# Altium footprint library pcb.PcbLib: 397 footprints (part 18 of 25)
Each footprint in its own frame and in the unit in brackets; x right, y up, seen from the top. Pads: shape width x height; smd on the part's side, far side on the other; paste and mask are expansions set on the pad; w line width, h text height; cw(c..) or ccw(c..) is an arc to the next point about the centre after c.
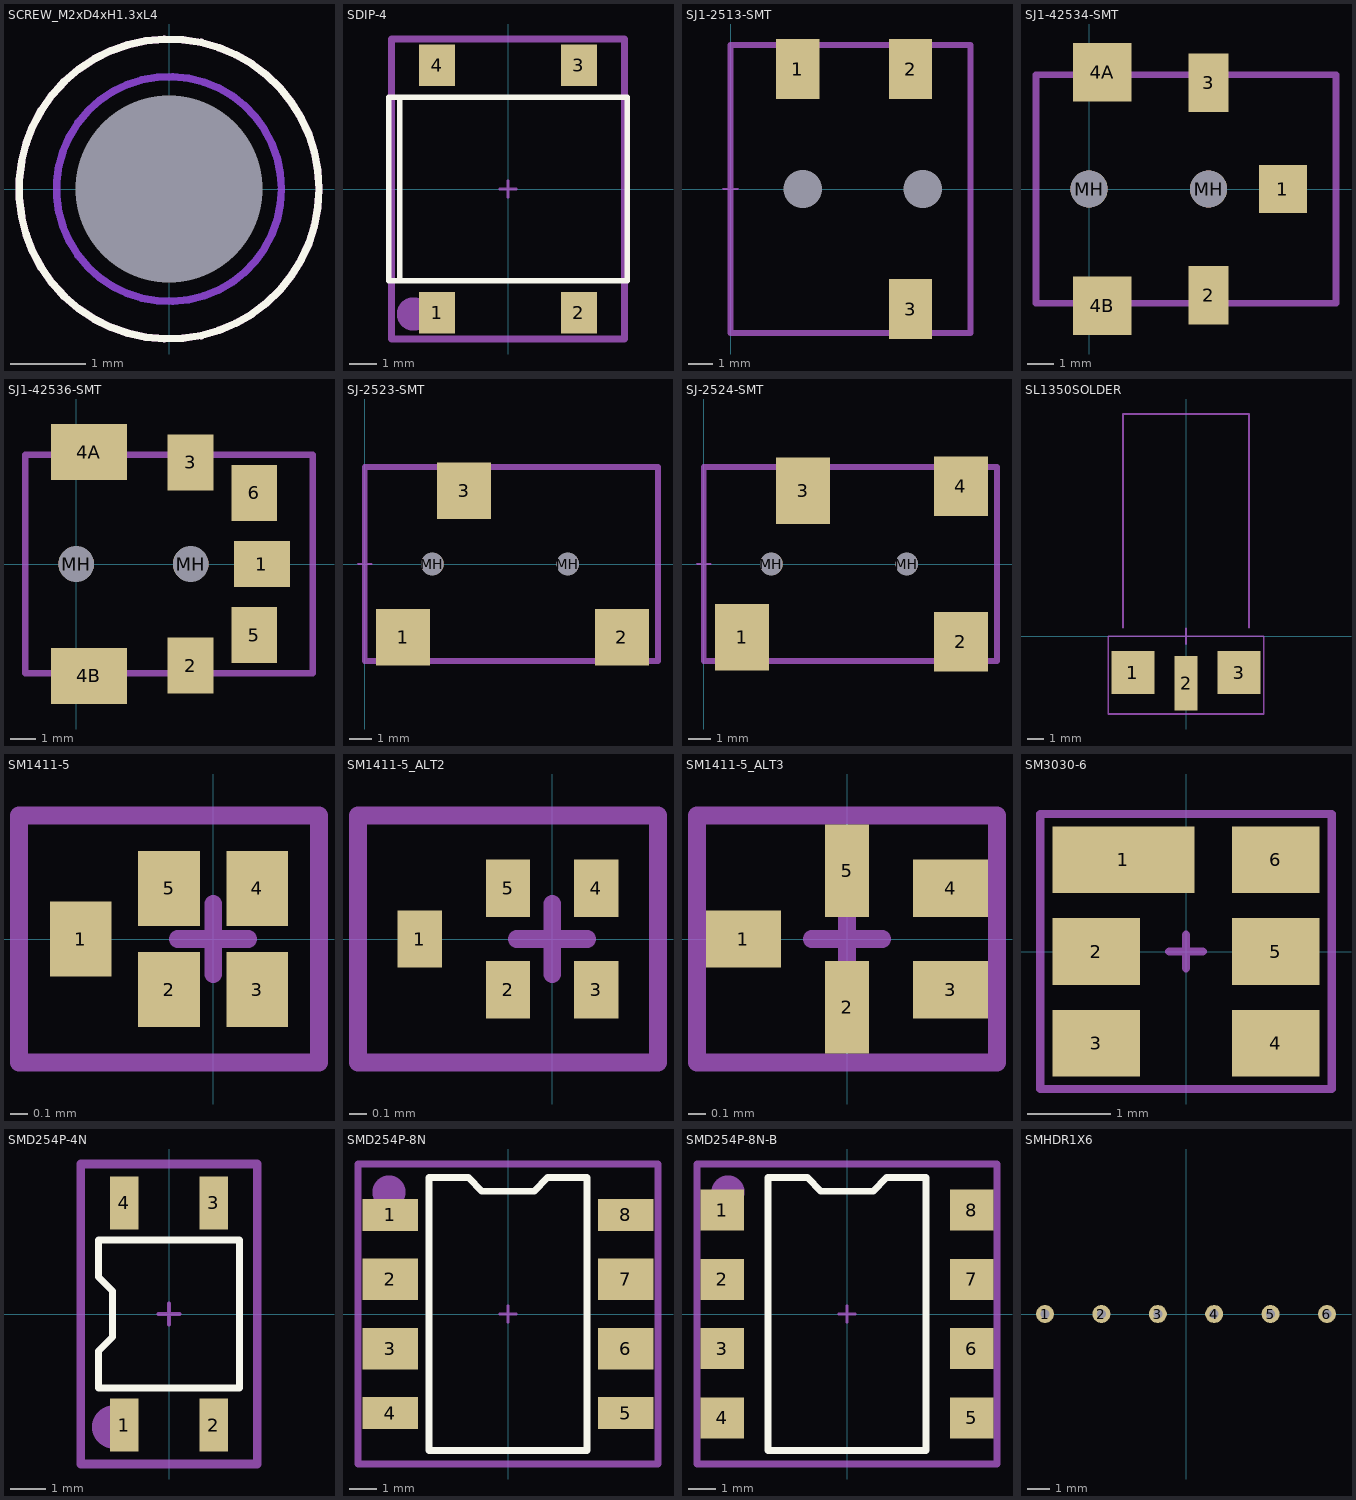
[diagram p17: the footprints below, top view; thin cyan lines are the x and y axes]

## SCREW_M2xD4xH1.3xL4 [mm]
height 1.6
pads (1):
  round 0 hole 2.5 unplated paste-25.4 mask+1.25: 0(0,0)
Top Layer keep-out:
  circle w0.1: c0,0 r2
Bottom Layer keep-out:
  circle w0.1: c0,0 r1.5
Top Overlay:
  circle w0.1: c0,0 r2
3D body: height 0, standoff -3, extent -1,-0.998 0.992,0.998
3D body: height 1.6, standoff 0, extent -1.984,-1.992 2,2

## SDIP-4 [mm]
height 2.6
pads (4):
  rect 1.3x1.5 smd: 1(-2.55,-4.45) 2(2.55,-4.45) 3(2.55,4.45) 4(-2.55,4.45)
Top Overlay:
  lines w0.2: -3.9,-3.3 -3.9,3.3 ; -4.3,-3.3 -4.3,3.3 4.3,3.3 4.3,-3.3 -4.3,-3.3
Mechanical 15:
  circle w1: c-3.4,-4.5 r0.1
  lines w0.1: -0.3,0 0.3,0 ; 0,-0.3 0,0.3
  lines w0.254: -4.2,-5.4 4.2,-5.4 4.2,5.4 -4.2,5.4 -4.2,-5.4
  text ".Designator" at -3.5,-2.8 h1.02
3D body: height 2.5, standoff 0, extent -4.2,-3.2 4.2,3.2

## SJ1-2513-SMT [mm] "2.5 MM AUDIO JACKS"
height 4.6
pads (5):
  rect 1.8x2.5 smd: 1(2.8,5) 2(7.5,5) 3(7.5,-5)
  round 0 hole 1.6: MH(3,0) MH(8,0)
Mechanical 15:
  lines w0.1: -0.3,0 0.3,0 ; 0,-0.3 0,0.3
  lines w0.254: 0,-6 0,6 10,6 10,-6 0,-6
  text "pcb_edge" at -0.6,-3.8 h1.02
  text ".Designator" at 0.5,-5.2 h1.02
3D body "SJ1-2513-SMT.stp": height 4.1, standoff -0.45, extent -2,-6 10,6

## SJ1-42534-SMT [mm] "2.5 MM AUDIO JACKS"
height 4.5
pads (7):
  rect 1.8x1.8 smd: 1(7.3,0)
  rect 1.5x2.2 smd mask+0.102: 2(4.5,-4)
  rect 1.5x2.2 smd: 3(4.5,4)
  rect 2.2x2.2 smd: 4A(0.5,4.4) 4B(0.5,-4.4)
  round 1.4 hole 1.4 unplated: MH(0,0) MH(4.5,0)
Mechanical 15:
  lines w0.1: -0.3,0 0.3,0 ; 0,-0.3 0,0.3
  lines w0.254: -2,-4.3 9.3,-4.3 9.3,4.3 -2,4.3 -2,-4.3
  text ".Designator" at -1.3,-3 h1.02
  text "pcb_edge" at -2.6,-3.6 h1.02
3D body "SJ1-42534-SMT.stp": height 5.05, standoff -0.55, extent -4.5,-5.2 8,5.2

## SJ1-42536-SMT [mm] "2.5 MM AUDIO JACKS"
height 4.5
pads (9):
  rect 2.2x1.8 smd: 1(7.3,0)
  rect 1.8x2.2 smd mask+0.102: 2(4.5,-4)
  rect 1.8x2.2 smd: 3(4.5,4) 5(7,-2.8) 6(7,2.8)
  rect 3x2.2 smd: 4A(0.5,4.4) 4B(0.5,-4.4)
  round 1.4 hole 1.4 unplated: MH(0,0) MH(4.5,0)
Mechanical 15:
  lines w0.1: -0.3,0 0.3,0 ; 0,-0.3 0,0.3
  lines w0.254: -2,-4.3 -2,4.3 9.3,4.3 9.3,-4.3 -2,-4.3
  text "pcb_edge" at -2.6,-3.6 h1.02
  text ".Designator" at -1.3,-3 h1.02
3D body "SJ1-42536-SMT.stp": height 5.1, standoff -0.5, extent -4.45,-5.2 8.05,5.2

## SJ-2523-SMT [mm] "2.5 MM AUDIO JACKS"
height 4.6
pads (5):
  rect 2.4x2.5 smd: 1(1.7,-3.25) 2(11.4,-3.25) 3(4.4,3.25)
  round 1 hole 1: MH(3,0) MH(9,0)
Mechanical 15:
  lines w0.1: -0.3,0 0.3,0 ; 0,-0.3 0,0.3
  lines w0.254: 0,-4.3 13,-4.3 13,4.3 0,4.3 0,-4.3
  text ".Designator" at 1.4,-3.5 h1.02
  text "pcb_edge" at -0.6,-3.8 h1.02
3D body "SJ-2523-SMT.stp": height 4.6, standoff -0.7, extent -1.45,-4 12.05,4

## SJ-2524-SMT [mm] "2.5 MM AUDIO JACKS"
height 4.6
pads (6):
  rect 2.4x2.95 smd: 1(1.7,-3.25) 3(4.4,3.25)
  rect 2.4x2.65 smd: 2(11.4,-3.45) 4(11.4,3.45)
  round 1 hole 1: MH(3,0) MH(9,0)
Mechanical 15:
  lines w0.1: -0.3,0 0.3,0 ; 0,-0.3 0,0.3
  lines w0.254: 0,-4.3 0,4.3 13,4.3 13,-4.3 0,-4.3
  text "pcb_edge" at -0.6,-3.8 h1.02
  text ".Designator" at 1.4,-3.5 h1.02
3D body "SJ-2523-SMT.stp": height 4.6, standoff -0.7, extent -1.45,-4 12.05,4

## SL1350SOLDER [mm] "SL1350"
pads (3):
  rect 2.6x2.6 smd: 1(-3.2,-2.2) 3(3.2,-2.2)
  rect 1.4x3.3 smd: 2(0,-2.85)
Mechanical 15:
  lines w0.1: -3.8,0.5 -3.8,13.4 3.8,13.4 3.8,0.5 ; -0.475,0 0.475,0 ; 0,-0.475 0,0.475 ; -4.7,-4.7 4.7,-4.7 4.7,0 -4.7,0 -4.7,-4.7
  text "pcb_edge" at 12.8,0.3 h1.02
  text ".Designator" at -4.132,-4.382 h1.02
3D body "SL1350 ANTENNA.stp": height 4.18, standoff -3.38, extent -3.782,-3.065 3.775,13.4

## SM1411-5 [mm] "SAW Filter 5 pin"
height 0.7
pads (5):
  rect 0.35x0.425 smd paste-0.03 mask+0.06: 1(-0.75,0) 2(-0.25,-0.288) 3(0.25,-0.288) 4(0.25,0.288) 5(-0.25,0.288)
Mechanical 15:
  lines w0.1: -0.2,0 0.2,0 ; 0,-0.2 0,0.2 ; -1.1,-0.7 0.6,-0.7 0.6,0.7 -1.1,0.7 -1.1,-0.7
  text ".Designator" at -0.9,-0.4 h0.51
3D body: height 0.5, standoff 0, extent -0.9,-0.5 0.5,0.5

## SM1411-5_ALT2 [mm] "SAW Filter 5 pin"
height 0.7
pads (5):
  rect 0.25x0.325 smd paste-0.03 mask+0.06: 1(-0.75,0) 2(-0.25,-0.288) 3(0.25,-0.288) 4(0.25,0.288) 5(-0.25,0.288)
Mechanical 15:
  lines w0.1: -0.2,0 0.2,0 ; 0,-0.2 0,0.2 ; -1.1,-0.7 0.6,-0.7 0.6,0.7 -1.1,0.7 -1.1,-0.7
  text ".Designator" at -0.9,-0.4 h0.51
3D body: height 0.5, standoff 0, extent -0.9,-0.5 0.5,0.5

## SM1411-5_ALT3 [mm] "SAW Filter 5 pin"
height 0.7
pads (5):
  rect 0.425x0.325 smd paste-0.03 mask+0.06: 1(-0.587,0) 3(0.587,-0.288) 4(0.587,0.288)
  rect 0.25x0.525 smd paste-0.03 mask+0.06: 2(0,-0.387) 5(0,0.388)
Mechanical 15:
  lines w0.1: -0.2,0 0.2,0 ; 0,-0.2 0,0.2 ; -0.85,-0.7 -0.85,0.7 0.85,0.7 0.85,-0.7 -0.85,-0.7
  text ".Designator" at -0.7,-0.55 h0.4
3D body: height 0.7, standoff 0, extent -0.7,-0.55 0.7,0.55

## SM3030-6 [mm] "SAW Filter 6 pin"
height 1.25
pads (6):
  rect 1.7x0.8 smd paste-0.03 mask+0.06: 1(-0.75,1.1)
  rect 1.05x0.8 smd paste-0.03 mask+0.06: 2(-1.075,0) 3(-1.075,-1.1) 4(1.075,-1.1) 5(1.075,0) 6(1.075,1.1)
Mechanical 15:
  lines w0.1: -0.2,0 0.2,0 ; 0,-0.2 0,0.2 ; -1.75,-1.65 -1.75,1.65 1.75,1.65 1.75,-1.65 -1.75,-1.65
  text ".Designator" at -1.3,-1.35 h0.51
3D body: height 0.5, standoff 0, extent -1.5,-1.5 1.5,1.5

## SMD254P-4N [mm]
height 2.7
pads (4):
  rect 0.8x1.5 smd: 1(-1.27,-3.15) 2(1.27,-3.15) 3(1.27,3.15) 4(-1.27,3.15)
Top Overlay:
  lines w0.2: -2,-2.1 -2,-1.05 -1.6,-0.65 -1.6,0.65 -2,1.05 -2,2.1 2,2.1 2,-2.1 -2,-2.1
Mechanical 15:
  circle w1.016: c-1.573,-3.2 r0.1
  lines w0.1: -0.3,0 0.3,0 ; 0,-0.3 0,0.3
  lines w0.254: -2.5,-4.25 -2.5,4.25 2.5,4.25 2.5,-4.25 -2.5,-4.25
  text ".Designator" at -2.032,1.118 h1.02
3D body: height 2.6, standoff 0, extent -1.8,-2.2 1.8,2.2

## SMD254P-8N [mil]
height 157.48
pads (8):
  rect 80x46 smd: 1(-170,143) 4(-170,-143) 5(170,-143) 8(170,143)
  rect 80x60 smd: 2(-170,50) 3(-170,-50) 6(170,-50) 7(170,50)
Top Overlay:
  lines w10: -114.17,-196.85 114.17,-196.85 114.17,196.85 57.09,196.85 37.4,177.17 -37.4,177.17 -57.09,196.85 -114.17,196.85 -114.17,-196.85
Mechanical 15:
  circle w40: c-171.94,176 r3.94
  lines w3.94: -11.81,0 11.81,0 ; 0,-11.81 0,11.81
  lines w10: -216.54,-216.54 -216.54,216.54 216.54,216.54 216.54,-216.54 -216.54,-216.54
  text ".Designator" at -78.74,147.64 h40
3D body: height 157.48, standoff 0, extent -125,-200 125,200

## SMD254P-8N-B [mm]
height 4
pads (8):
  rect 1.6x1.5 smd: 1(-4.58,3.81) 2(-4.58,1.27) 3(-4.58,-1.27) 4(-4.58,-3.81) 5(4.58,-3.81) 6(4.58,-1.27) 7(4.58,1.27) 8(4.58,3.81)
Top Overlay:
  lines w0.254: -2.9,-5 2.9,-5 2.9,5 1.45,5 0.95,4.5 -0.95,4.5 -1.45,5 -2.9,5 -2.9,-5
Mechanical 15:
  circle w1.016: c-4.367,4.47 r0.1
  lines w0.1: -0.3,0 0.3,0 ; 0,-0.3 0,0.3
  lines w0.254: -5.5,-5.5 -5.5,5.5 5.5,5.5 5.5,-5.5 -5.5,-5.5
  text ".Designator" at -2,3.75 h1.02
3D body: height 4, standoff 0, extent -3.81,-5.08 3.81,5.08

## SMHDR1X6 [mil] "Connector; Header; 6 Position"
pads (6):
  round 32 / inner round 0 / far side oval 70.87x98.43 hole 16: 1(-250,0) 2(-150,0) 3(-50,0) 4(50,0) 5(150,0) 6(250,0)